# Altium schematic symbol library WR-TBL_Pluggable PCB Header.SchLib: 719 symbols (part 3 of 5) (continued)
## 691328310006 (continued)

## 691328310008
designator P?
WR-TBL Serie 3283 Double Level Horizontal PCB Header with Flanges & Nut Type, Pluggable, pitch 3.81mm, 8p; Part Number: 691328310008; Compliance: RoHS; Modularity: No; Pin Number: 8; Rated Current [UL]: 10A; Working Voltage [UL]: 300VAC; ComponentLink1Description: Manufacturer; ComponentLink1URL: http://www.we-online.de; ComponentLink2URL: https://katalog.we-online.de/em/datasheet/691328310008.pdf; ComponentLink2Description: Datasheet; Mounting Technology: THT; Packaging: Box; Operating Temperature: -40 to +105degC; PCB/Cable/Panel: PCB; Pitch: 3.81mm; Published Date: October 2019; Type: Double Level Horizontal; Publisher: Wurth Elektronik; Application: Pluggable
footprint 691328310008
pins: 1, 2, 3, 4, 5, 6, 7, 8

## 691328310010
designator P?
WR-TBL Serie 3283 Double Level Horizontal PCB Header with Flanges & Nut Type, Pluggable, pitch 3.81mm, 10p; Part Number: 691328310010; Compliance: RoHS; Modularity: No; Pin Number: 10; Rated Current [UL]: 10A; Working Voltage [UL]: 300VAC; ComponentLink1Description: Manufacturer; ComponentLink1URL: http://www.we-online.de; ComponentLink2URL: https://katalog.we-online.de/em/datasheet/691328310010.pdf; ComponentLink2Description: Datasheet; Mounting Technology: THT; Packaging: Box; Operating Temperature: -40 to +105degC; PCB/Cable/Panel: PCB; Pitch: 3.81mm; Published Date: October 2019; Type: Double Level Horizontal; Publisher: Wurth Elektronik; Application: Pluggable
footprint 691328310010
pins: 1, 2, 3, 4, 5, 6, 7, 8, 9, 10

## 691328310012
designator P?
WR-TBL Serie 3283 Double Level Horizontal PCB Header with Flanges & Nut Type, Pluggable, pitch 3.81mm, 12p; Part Number: 691328310012; Compliance: RoHS; Modularity: No; Pin Number: 12; Rated Current [UL]: 10A; Working Voltage [UL]: 300VAC; ComponentLink1Description: Manufacturer; ComponentLink1URL: http://www.we-online.de; ComponentLink2URL: https://katalog.we-online.de/em/datasheet/691328310012.pdf; ComponentLink2Description: Datasheet; Mounting Technology: THT; Packaging: Box; Operating Temperature: -40 to +105degC; PCB/Cable/Panel: PCB; Pitch: 3.81mm; Published Date: October 2019; Type: Double Level Horizontal; Publisher: Wurth Elektronik; Application: Pluggable
footprint 691328310012
pins: 1, 2, 3, 4, 5, 6, 7, 8, 9, 10, 11, 12

## 691328310016
designator P?
WR-TBL Serie 3283 Double Level Horizontal PCB Header with Flanges & Nut Type, Pluggable, pitch 3.81mm, 16p; Part Number: 691328310016; Compliance: RoHS; Modularity: No; Pin Number: 16; Rated Current [UL]: 10A; Working Voltage [UL]: 300VAC; ComponentLink1Description: Manufacturer; ComponentLink1URL: http://www.we-online.de; ComponentLink2URL: https://katalog.we-online.de/em/datasheet/691328310016.pdf; ComponentLink2Description: Datasheet; Mounting Technology: THT; Packaging: Box; Operating Temperature: -40 to +105degC; PCB/Cable/Panel: PCB; Pitch: 3.81mm; Published Date: October 2019; Type: Double Level Horizontal; Publisher: Wurth Elektronik; Application: Pluggable
footprint 691328310016
pins: 1, 2, 3, 4, 5, 6, 7, 8, 9, 10, 11, 12, 13, 14, 15, 16

## 691329300004
designator P?
WR-TBL Serie 3293 Double Level Vertical PCB Header, Pluggable, pitch 3.81mm, 4p; Part Number: 691329300004; Compliance: RoHS; Modularity: No; Pin Number: 4; Rated Current [UL]: 10A; Working Voltage [UL]: 300VAC; ComponentLink1Description: Manufacturer; ComponentLink1URL: http://www.we-online.de; ComponentLink2URL: https://katalog.we-online.de/em/datasheet/691329300004.pdf; ComponentLink2Description: Datasheet; Mounting Technology: THT; Packaging: Box; Operating Temperature: -40 to +105degC; PCB/Cable/Panel: PCB; Pitch: 3.81mm; Published Date: October 2019; Type: Double Level Vertical; Publisher: Wurth Elektronik; Application: Pluggable
footprint 691329300004
pins: 1, 2, 3, 4

## 691329300006
designator P?
WR-TBL Serie 3293 Double Level Vertical PCB Header, Pluggable, pitch 3.81mm, 6p; Part Number: 691329300006; Compliance: RoHS; Modularity: No; Pin Number: 6; Rated Current [UL]: 10A; Working Voltage [UL]: 300VAC; ComponentLink1Description: Manufacturer; ComponentLink1URL: http://www.we-online.de; ComponentLink2URL: https://katalog.we-online.de/em/datasheet/691329300006.pdf; ComponentLink2Description: Datasheet; Mounting Technology: THT; Packaging: Box; Operating Temperature: -40 to +105degC; PCB/Cable/Panel: PCB; Pitch: 3.81mm; Published Date: October 2019; Type: Double Level Vertical; Publisher: Wurth Elektronik; Application: Pluggable
footprint 691329300006
pins: 1, 2, 3, 4, 5, 6

## 691329300008
designator P?
WR-TBL Serie 3293 Double Level Vertical PCB Header, Pluggable, pitch 3.81mm, 8p; Part Number: 691329300008; Compliance: RoHS; Modularity: No; Pin Number: 8; Rated Current [UL]: 10A; Working Voltage [UL]: 300VAC; ComponentLink1Description: Manufacturer; ComponentLink1URL: http://www.we-online.de; ComponentLink2URL: https://katalog.we-online.de/em/datasheet/691329300008.pdf; ComponentLink2Description: Datasheet; Mounting Technology: THT; Packaging: Box; Operating Temperature: -40 to +105degC; PCB/Cable/Panel: PCB; Pitch: 3.81mm; Published Date: October 2019; Type: Double Level Vertical; Publisher: Wurth Elektronik; Application: Pluggable
footprint 691329300008
pins: 1, 2, 3, 4, 5, 6, 7, 8

## 691329300010
designator P?
WR-TBL Serie 3293 Double Level Vertical PCB Header, Pluggable, pitch 3.81mm, 10p; Part Number: 691329300010; Compliance: RoHS; Modularity: No; Pin Number: 10; Rated Current [UL]: 10A; Working Voltage [UL]: 300VAC; ComponentLink1Description: Manufacturer; ComponentLink1URL: http://www.we-online.de; ComponentLink2URL: https://katalog.we-online.de/em/datasheet/691329300010.pdf; ComponentLink2Description: Datasheet; Mounting Technology: THT; Packaging: Box; Operating Temperature: -40 to +105degC; PCB/Cable/Panel: PCB; Pitch: 3.81mm; Published Date: October 2019; Type: Double Level Vertical; Publisher: Wurth Elektronik; Application: Pluggable
footprint 691329300010
pins: 1, 2, 3, 4, 5, 6, 7, 8, 9, 10

## 691329300012
designator P?
WR-TBL Serie 3293 Double Level Vertical PCB Header, Pluggable, pitch 3.81mm, 12p; Part Number: 691329300012; Compliance: RoHS; Modularity: No; Pin Number: 12; Rated Current [UL]: 10A; Working Voltage [UL]: 300VAC; ComponentLink1Description: Manufacturer; ComponentLink1URL: http://www.we-online.de; ComponentLink2URL: https://katalog.we-online.de/em/datasheet/691329300012.pdf; ComponentLink2Description: Datasheet; Mounting Technology: THT; Packaging: Box; Operating Temperature: -40 to +105degC; PCB/Cable/Panel: PCB; Pitch: 3.81mm; Published Date: October 2019; Type: Double Level Vertical; Publisher: Wurth Elektronik; Application: Pluggable
footprint 691329300012
pins: 1, 2, 3, 4, 5, 6, 7, 8, 9, 10, 11, 12

## 691329300016
designator P?
WR-TBL Serie 3293 Double Level Vertical PCB Header, Pluggable, pitch 3.81mm, 16p; Part Number: 691329300016; Compliance: RoHS; Modularity: No; Pin Number: 16; Rated Current [UL]: 10A; Working Voltage [UL]: 300VAC; ComponentLink1Description: Manufacturer; ComponentLink1URL: http://www.we-online.de; ComponentLink2URL: https://katalog.we-online.de/em/datasheet/691329300016.pdf; ComponentLink2Description: Datasheet; Mounting Technology: THT; Packaging: Box; Operating Temperature: -40 to +105degC; PCB/Cable/Panel: PCB; Pitch: 3.81mm; Published Date: October 2019; Type: Double Level Vertical; Publisher: Wurth Elektronik; Application: Pluggable
footprint 691329300016
pins: 1, 2, 3, 4, 5, 6, 7, 8, 9, 10, 11, 12, 13, 14, 15, 16

## 691330300004
designator P?
WR-TBL Serie 3303 Double Level Vertical PCB Header with Flanges & Nut Type, Pluggable, pitch 3.81mm, 4p; Part Number: 691330300004; Compliance: RoHS; Modularity: No; Pin Number: 4; Rated Current [UL]: 10A; Working Voltage [UL]: 300VAC; ComponentLink1Description: Manufacturer; ComponentLink1URL: http://www.we-online.de; ComponentLink2URL: https://katalog.we-online.de/em/datasheet/691330300004.pdf; ComponentLink2Description: Datasheet; Mounting Technology: THT; Packaging: Box; Operating Temperature: -40 to +105degC; PCB/Cable/Panel: PCB; Pitch: 3.81mm; Published Date: October 2019; Type: Double Level Vertical; Publisher: Wurth Elektronik; Application: Pluggable
footprint 691330300004
pins: 1, 2, 3, 4

## 691330300006
designator P?
WR-TBL Serie 3303 Double Level Vertical PCB Header with Flanges & Nut Type, Pluggable, pitch 3.81mm, 6p; Part Number: 691330300006; Compliance: RoHS; Modularity: No; Pin Number: 6; Rated Current [UL]: 10A; Working Voltage [UL]: 300VAC; ComponentLink1Description: Manufacturer; ComponentLink1URL: http://www.we-online.de; ComponentLink2URL: https://katalog.we-online.de/em/datasheet/691330300006.pdf; ComponentLink2Description: Datasheet; Mounting Technology: THT; Packaging: Box; Operating Temperature: -40 to +105degC; PCB/Cable/Panel: PCB; Pitch: 3.81mm; Published Date: October 2019; Type: Double Level Vertical; Publisher: Wurth Elektronik; Application: Pluggable
footprint 691330300006
pins: 1, 2, 3, 4, 5, 6

## 691330300008
designator P?
WR-TBL Serie 3303 Double Level Vertical PCB Header with Flanges & Nut Type, Pluggable, pitch 3.81mm, 8p; Part Number: 691330300008; Compliance: RoHS; Modularity: No; Pin Number: 8; Rated Current [UL]: 10A; Working Voltage [UL]: 300VAC; ComponentLink1Description: Manufacturer; ComponentLink1URL: http://www.we-online.de; ComponentLink2URL: https://katalog.we-online.de/em/datasheet/691330300008.pdf; ComponentLink2Description: Datasheet; Mounting Technology: THT; Packaging: Box; Operating Temperature: -40 to +105degC; PCB/Cable/Panel: PCB; Pitch: 3.81mm; Published Date: October 2019; Type: Double Level Vertical; Publisher: Wurth Elektronik; Application: Pluggable
footprint 691330300008
pins: 1, 2, 3, 4, 5, 6, 7, 8

## 691330300010
designator P?
WR-TBL Serie 3303 Double Level Vertical PCB Header with Flanges & Nut Type, Pluggable, pitch 3.81mm, 10p; Part Number: 691330300010; Compliance: RoHS; Modularity: No; Pin Number: 10; Rated Current [UL]: 10A; Working Voltage [UL]: 300VAC; ComponentLink1Description: Manufacturer; ComponentLink1URL: http://www.we-online.de; ComponentLink2URL: https://katalog.we-online.de/em/datasheet/691330300010.pdf; ComponentLink2Description: Datasheet; Mounting Technology: THT; Packaging: Box; Operating Temperature: -40 to +105degC; PCB/Cable/Panel: PCB; Pitch: 3.81mm; Published Date: October 2019; Type: Double Level Vertical; Publisher: Wurth Elektronik; Application: Pluggable
footprint 691330300010
pins: 1, 2, 3, 4, 5, 6, 7, 8, 9, 10

## 691330300012
designator P?
WR-TBL Serie 3303 Double Level Vertical PCB Header with Flanges & Nut Type, Pluggable, pitch 3.81mm, 12p; Part Number: 691330300012; Compliance: RoHS; Modularity: No; Pin Number: 12; Rated Current [UL]: 10A; Working Voltage [UL]: 300VAC; ComponentLink1Description: Manufacturer; ComponentLink1URL: http://www.we-online.de; ComponentLink2URL: https://katalog.we-online.de/em/datasheet/691330300012.pdf; ComponentLink2Description: Datasheet; Mounting Technology: THT; Packaging: Box; Operating Temperature: -40 to +105degC; PCB/Cable/Panel: PCB; Pitch: 3.81mm; Published Date: October 2019; Type: Double Level Vertical; Publisher: Wurth Elektronik; Application: Pluggable
footprint 691330300012
pins: 1, 2, 3, 4, 5, 6, 7, 8, 9, 10, 11, 12

## 691330300016
designator P?
WR-TBL Serie 3303 Double Level Vertical PCB Header with Flanges & Nut Type, Pluggable, pitch 3.81mm, 16p; Part Number: 691330300016; Compliance: RoHS; Modularity: No; Pin Number: 16; Rated Current [UL]: 10A; Working Voltage [UL]: 300VAC; ComponentLink1Description: Manufacturer; ComponentLink1URL: http://www.we-online.de; ComponentLink2URL: https://katalog.we-online.de/em/datasheet/691330300016.pdf; ComponentLink2Description: Datasheet; Mounting Technology: THT; Packaging: Box; Operating Temperature: -40 to +105degC; PCB/Cable/Panel: PCB; Pitch: 3.81mm; Published Date: October 2019; Type: Double Level Vertical; Publisher: Wurth Elektronik; Application: Pluggable
footprint 691330300016
pins: 1, 2, 3, 4, 5, 6, 7, 8, 9, 10, 11, 12, 13, 14, 15, 16

## 691331510004
designator P?
WR-TBL Serie 3315 Double Level Horizontal PCB Header with Flanges, Pluggable, pitch 5.08mm, 4p; Part Number: 691331510004; Compliance: RoHS; Modularity: No; Pin Number: 4; Rated Current [UL]: 20A; Working Voltage [UL]: 300VAC; ComponentLink1Description: Manufacturer; ComponentLink1URL: http://www.we-online.de; ComponentLink2URL: https://katalog.we-online.de/em/datasheet/691331510004.pdf; ComponentLink2Description: Datasheet; Mounting Technology: THT; Packaging: Box; Operating Temperature: -40 to +105degC; PCB/Cable/Panel: PCB; Pitch: 5.08mm; Published Date: October 2019; Type: Double Level Horizontal; Publisher: Wurth Elektronik; Application: Pluggable
footprint 691331510004
pins: 1, 2, 3, 4

## 691331510006
designator P?
WR-TBL Serie 3315 Double Level Horizontal PCB Header with Flanges, Pluggable, pitch 5.08mm, 6p; Part Number: 691331510006; Compliance: RoHS; Modularity: No; Pin Number: 6; Rated Current [UL]: 20A; Working Voltage [UL]: 300VAC; ComponentLink1Description: Manufacturer; ComponentLink1URL: http://www.we-online.de; ComponentLink2URL: https://katalog.we-online.de/em/datasheet/691331510006.pdf; ComponentLink2Description: Datasheet; Mounting Technology: THT; Packaging: Box; Operating Temperature: -40 to +105degC; PCB/Cable/Panel: PCB; Pitch: 5.08mm; Published Date: October 2019; Type: Double Level Horizontal; Publisher: Wurth Elektronik; Application: Pluggable
footprint 691331510006
pins: 1, 2, 3, 4, 5, 6

## 691331510008
designator P?
WR-TBL Serie 3315 Double Level Horizontal PCB Header with Flanges, Pluggable, pitch 5.08mm, 8p; Part Number: 691331510008; Compliance: RoHS; Modularity: No; Pin Number: 8; Rated Current [UL]: 20A; Working Voltage [UL]: 300VAC; ComponentLink1Description: Manufacturer; ComponentLink1URL: http://www.we-online.de; ComponentLink2URL: https://katalog.we-online.de/em/datasheet/691331510008.pdf; ComponentLink2Description: Datasheet; Mounting Technology: THT; Packaging: Box; Operating Temperature: -40 to +105degC; PCB/Cable/Panel: PCB; Pitch: 5.08mm; Published Date: October 2019; Type: Double Level Horizontal; Publisher: Wurth Elektronik; Application: Pluggable
footprint 691331510008
pins: 1, 2, 3, 4, 5, 6, 7, 8

## 691331510010
designator P?
WR-TBL Serie 3315 Double Level Horizontal PCB Header with Flanges, Pluggable, pitch 5.08mm, 10p; Part Number: 691331510010; Compliance: RoHS; Modularity: No; Pin Number: 10; Rated Current [UL]: 20A; Working Voltage [UL]: 300VAC; ComponentLink1Description: Manufacturer; ComponentLink1URL: http://www.we-online.de; ComponentLink2URL: https://katalog.we-online.de/em/datasheet/691331510010.pdf; ComponentLink2Description: Datasheet; Mounting Technology: THT; Packaging: Box; Operating Temperature: -40 to +105degC; PCB/Cable/Panel: PCB; Pitch: 5.08mm; Published Date: October 2019; Type: Double Level Horizontal; Publisher: Wurth Elektronik; Application: Pluggable
footprint 691331510010
pins: 1, 2, 3, 4, 5, 6, 7, 8, 9, 10

## 691331510012
designator P?
WR-TBL Serie 3315 Double Level Horizontal PCB Header with Flanges, Pluggable, pitch 5.08mm, 12p; Part Number: 691331510012; Compliance: RoHS; Modularity: No; Pin Number: 12; Rated Current [UL]: 20A; Working Voltage [UL]: 300VAC; ComponentLink1Description: Manufacturer; ComponentLink1URL: http://www.we-online.de; ComponentLink2URL: https://katalog.we-online.de/em/datasheet/691331510012.pdf; ComponentLink2Description: Datasheet; Mounting Technology: THT; Packaging: Box; Operating Temperature: -40 to +105degC; PCB/Cable/Panel: PCB; Pitch: 5.08mm; Published Date: October 2019; Type: Double Level Horizontal; Publisher: Wurth Elektronik; Application: Pluggable
footprint 691331510012
pins: 1, 2, 3, 4, 5, 6, 7, 8, 9, 10, 11, 12

## 691331510016
designator P?
WR-TBL Serie 3315 Double Level Horizontal PCB Header with Flanges, Pluggable, pitch 5.08mm, 16p; Part Number: 691331510016; Compliance: RoHS; Modularity: No; Pin Number: 16; Rated Current [UL]: 20A; Working Voltage [UL]: 300VAC; ComponentLink1Description: Manufacturer; ComponentLink1URL: http://www.we-online.de; ComponentLink2URL: https://katalog.we-online.de/em/datasheet/691331510016.pdf; ComponentLink2Description: Datasheet; Mounting Technology: THT; Packaging: Box; Operating Temperature: -40 to +105degC; PCB/Cable/Panel: PCB; Pitch: 5.08mm; Published Date: October 2019; Type: Double Level Horizontal; Publisher: Wurth Elektronik; Application: Pluggable
footprint 691331510016
pins: 1, 2, 3, 4, 5, 6, 7, 8, 9, 10, 11, 12, 13, 14, 15, 16

## 691332510004
designator P?
WR-TBL Serie 3325 Double Level Horizontal PCB Header with Flanges & Nut Type, Pluggable, pitch 5.08mm, 4p; Part Number: 691332510004; Compliance: RoHS; Modularity: No; Pin Number: 4; Rated Current [UL]: 20A; Working Voltage [UL]: 300VAC; ComponentLink1Description: Manufacturer; ComponentLink1URL: http://www.we-online.de; ComponentLink2URL: https://katalog.we-online.de/em/datasheet/691332510004.pdf; ComponentLink2Description: Datasheet; Mounting Technology: THT; Packaging: Box; Operating Temperature: -40 to +105degC; PCB/Cable/Panel: PCB; Pitch: 5.08mm; Published Date: October 2019; Type: Double Level Horizontal; Publisher: Wurth Elektronik; Application: Pluggable
footprint 691332510004
pins: 1, 2, 3, 4

## 691332510006
designator P?
WR-TBL Serie 3325 Double Level Horizontal PCB Header with Flanges & Nut Type, Pluggable, pitch 5.08mm, 6p; Part Number: 691332510006; Compliance: RoHS; Modularity: No; Pin Number: 6; Rated Current [UL]: 20A; Working Voltage [UL]: 300VAC; ComponentLink1Description: Manufacturer; ComponentLink1URL: http://www.we-online.de; ComponentLink2URL: https://katalog.we-online.de/em/datasheet/691332510006.pdf; ComponentLink2Description: Datasheet; Mounting Technology: THT; Packaging: Box; Operating Temperature: -40 to +105degC; PCB/Cable/Panel: PCB; Pitch: 5.08mm; Published Date: October 2019; Type: Double Level Horizontal; Publisher: Wurth Elektronik; Application: Pluggable
footprint 691332510006
pins: 1, 2, 3, 4, 5, 6

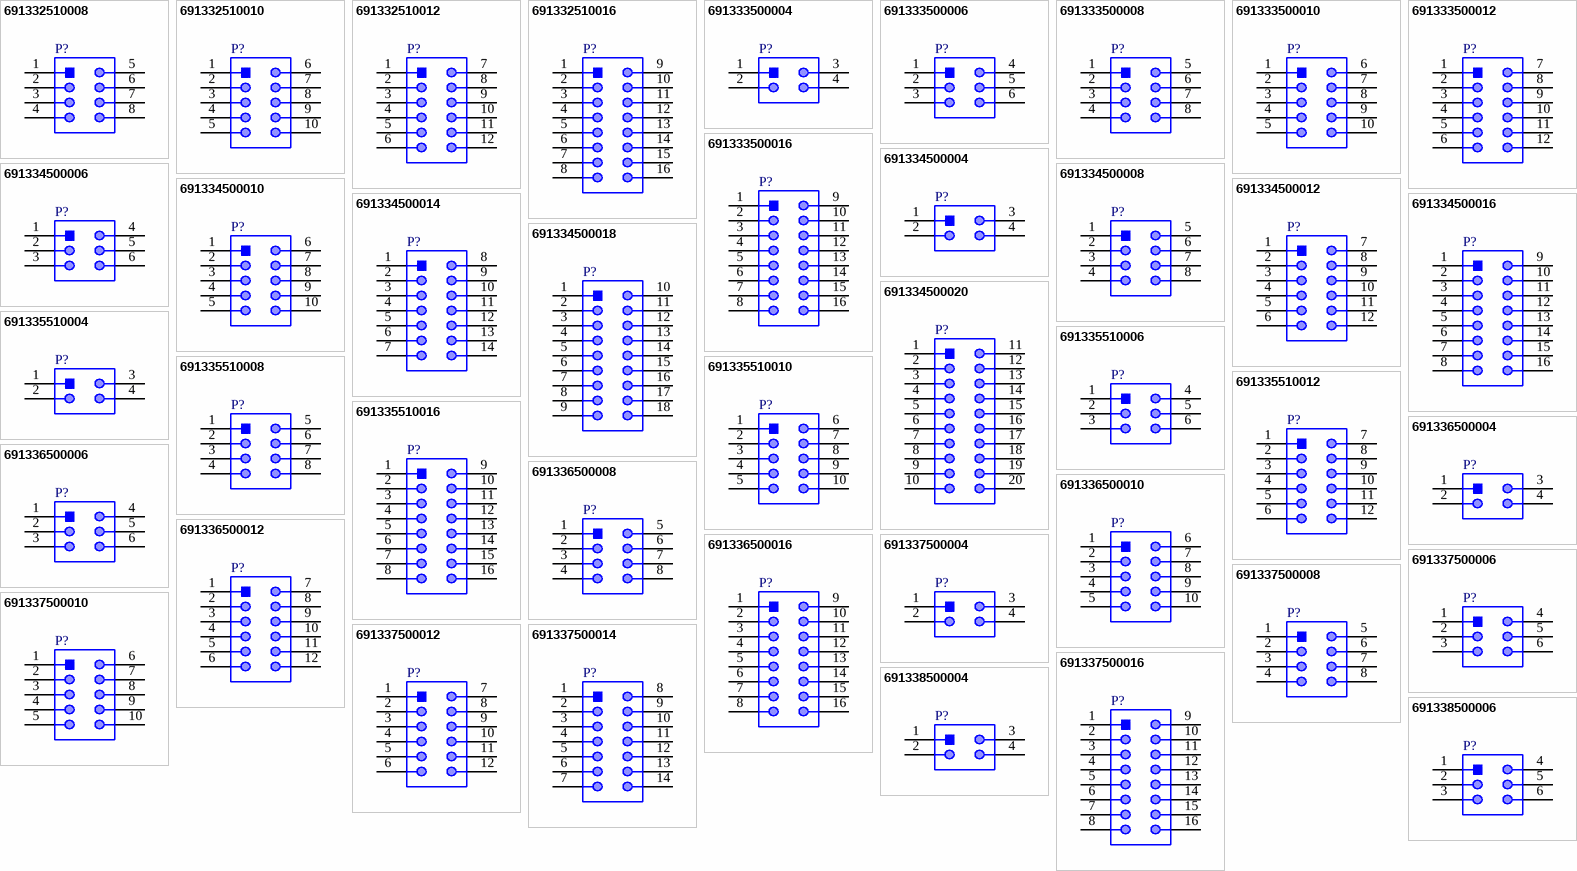
[diagram p12: symbols 691332510008 to 691338500006]

## 691332510008
designator P?
WR-TBL Serie 3325 Double Level Horizontal PCB Header with Flanges & Nut Type, Pluggable, pitch 5.08mm, 8p; Part Number: 691332510008; Compliance: RoHS; Modularity: No; Pin Number: 8; Rated Current [UL]: 20A; Working Voltage [UL]: 300VAC; ComponentLink1Description: Manufacturer; ComponentLink1URL: http://www.we-online.de; ComponentLink2URL: https://katalog.we-online.de/em/datasheet/691332510008.pdf; ComponentLink2Description: Datasheet; Mounting Technology: THT; Packaging: Box; Operating Temperature: -40 to +105degC; PCB/Cable/Panel: PCB; Pitch: 5.08mm; Published Date: October 2019; Type: Double Level Horizontal; Publisher: Wurth Elektronik; Application: Pluggable
footprint 691332510008
pins: 1, 2, 3, 4, 5, 6, 7, 8

## 691332510010
designator P?
WR-TBL Serie 3325 Double Level Horizontal PCB Header with Flanges & Nut Type, Pluggable, pitch 5.08mm, 10p; Part Number: 691332510010; Compliance: RoHS; Modularity: No; Pin Number: 10; Rated Current [UL]: 20A; Working Voltage [UL]: 300VAC; ComponentLink1Description: Manufacturer; ComponentLink1URL: http://www.we-online.de; ComponentLink2URL: https://katalog.we-online.de/em/datasheet/691332510010.pdf; ComponentLink2Description: Datasheet; Mounting Technology: THT; Packaging: Box; Operating Temperature: -40 to +105degC; PCB/Cable/Panel: PCB; Pitch: 5.08mm; Published Date: October 2019; Type: Double Level Horizontal; Publisher: Wurth Elektronik; Application: Pluggable
footprint 691332510010
pins: 1, 2, 3, 4, 5, 6, 7, 8, 9, 10

## 691332510012
designator P?
WR-TBL Serie 3325 Double Level Horizontal PCB Header with Flanges & Nut Type, Pluggable, pitch 5.08mm, 12p; Part Number: 691332510012; Compliance: RoHS; Modularity: No; Pin Number: 12; Rated Current [UL]: 20A; Working Voltage [UL]: 300VAC; ComponentLink1Description: Manufacturer; ComponentLink1URL: http://www.we-online.de; ComponentLink2URL: https://katalog.we-online.de/em/datasheet/691332510012.pdf; ComponentLink2Description: Datasheet; Mounting Technology: THT; Packaging: Box; Operating Temperature: -40 to +105degC; PCB/Cable/Panel: PCB; Pitch: 5.08mm; Published Date: October 2019; Type: Double Level Horizontal; Publisher: Wurth Elektronik; Application: Pluggable
footprint 691332510012
pins: 1, 2, 3, 4, 5, 6, 7, 8, 9, 10, 11, 12

## 691332510016
designator P?
WR-TBL Serie 3325 Double Level Horizontal PCB Header with Flanges & Nut Type, Pluggable, pitch 5.08mm, 16p; Part Number: 691332510016; Compliance: RoHS; Modularity: No; Pin Number: 16; Rated Current [UL]: 20A; Working Voltage [UL]: 300VAC; ComponentLink1Description: Manufacturer; ComponentLink1URL: http://www.we-online.de; ComponentLink2URL: https://katalog.we-online.de/em/datasheet/691332510016.pdf; ComponentLink2Description: Datasheet; Mounting Technology: THT; Packaging: Box; Operating Temperature: -40 to +105degC; PCB/Cable/Panel: PCB; Pitch: 5.08mm; Published Date: October 2019; Type: Double Level Horizontal; Publisher: Wurth Elektronik; Application: Pluggable
footprint 691332510016
pins: 1, 2, 3, 4, 5, 6, 7, 8, 9, 10, 11, 12, 13, 14, 15, 16

## 691333500004
designator P?
WR-TBL Serie 3335 Double Level Vertical PCB Header with Flanges, Pluggable, pitch 5.08mm, 4p; Part Number: 691333500004; Compliance: RoHS; Modularity: No; Pin Number: 4; Rated Current [UL]: 20A; Working Voltage [UL]: 300VAC; ComponentLink1Description: Manufacturer; ComponentLink1URL: http://www.we-online.de; ComponentLink2URL: https://katalog.we-online.de/em/datasheet/691333500004.pdf; ComponentLink2Description: Datasheet; Mounting Technology: THT; Packaging: Box; Operating Temperature: -40 to +105degC; PCB/Cable/Panel: PCB; Pitch: 5.08mm; Published Date: October 2019; Type: Double Level Vertical; Publisher: Wurth Elektronik; Application: Pluggable
footprint 691333500004
pins: 1, 2, 3, 4

## 691333500006
designator P?
WR-TBL Serie 3335 Double Level Vertical PCB Header with Flanges, Pluggable, pitch 5.08mm, 6p; Part Number: 691333500006; Compliance: RoHS; Modularity: No; Pin Number: 6; Rated Current [UL]: 20A; Working Voltage [UL]: 300VAC; ComponentLink1Description: Manufacturer; ComponentLink1URL: http://www.we-online.de; ComponentLink2URL: https://katalog.we-online.de/em/datasheet/691333500006.pdf; ComponentLink2Description: Datasheet; Mounting Technology: THT; Packaging: Box; Operating Temperature: -40 to +105degC; PCB/Cable/Panel: PCB; Pitch: 5.08mm; Published Date: October 2019; Type: Double Level Vertical; Publisher: Wurth Elektronik; Application: Pluggable
footprint 691333500006
pins: 1, 2, 3, 4, 5, 6

## 691333500008
designator P?
WR-TBL Serie 3335 Double Level Vertical PCB Header with Flanges, Pluggable, pitch 5.08mm, 8p; Part Number: 691333500008; Compliance: RoHS; Modularity: No; Pin Number: 8; Rated Current [UL]: 20A; Working Voltage [UL]: 300VAC; ComponentLink1Description: Manufacturer; ComponentLink1URL: http://www.we-online.de; ComponentLink2URL: https://katalog.we-online.de/em/datasheet/691333500008.pdf; ComponentLink2Description: Datasheet; Mounting Technology: THT; Packaging: Box; Operating Temperature: -40 to +105degC; PCB/Cable/Panel: PCB; Pitch: 5.08mm; Published Date: October 2019; Type: Double Level Vertical; Publisher: Wurth Elektronik; Application: Pluggable
footprint 691333500008
pins: 1, 2, 3, 4, 5, 6, 7, 8

## 691333500010
designator P?
WR-TBL Serie 3335 Double Level Vertical PCB Header with Flanges, Pluggable, pitch 5.08mm, 10p; Part Number: 691333500010; Compliance: RoHS; Modularity: No; Pin Number: 10; Rated Current [UL]: 20A; Working Voltage [UL]: 300VAC; ComponentLink1Description: Manufacturer; ComponentLink1URL: http://www.we-online.de; ComponentLink2URL: https://katalog.we-online.de/em/datasheet/691333500010.pdf; ComponentLink2Description: Datasheet; Mounting Technology: THT; Packaging: Box; Operating Temperature: -40 to +105degC; PCB/Cable/Panel: PCB; Pitch: 5.08mm; Published Date: October 2019; Type: Double Level Vertical; Publisher: Wurth Elektronik; Application: Pluggable
footprint 691333500010
pins: 1, 2, 3, 4, 5, 6, 7, 8, 9, 10

## 691333500012
designator P?
WR-TBL Serie 3335 Double Level Vertical PCB Header with Flanges, Pluggable, pitch 5.08mm, 12p; Part Number: 691333500012; Compliance: RoHS; Modularity: No; Pin Number: 12; Rated Current [UL]: 20A; Working Voltage [UL]: 300VAC; ComponentLink1Description: Manufacturer; ComponentLink1URL: http://www.we-online.de; ComponentLink2URL: https://katalog.we-online.de/em/datasheet/691333500012.pdf; ComponentLink2Description: Datasheet; Mounting Technology: THT; Packaging: Box; Operating Temperature: -40 to +105degC; PCB/Cable/Panel: PCB; Pitch: 5.08mm; Published Date: October 2019; Type: Double Level Vertical; Publisher: Wurth Elektronik; Application: Pluggable
footprint 691333500012
pins: 1, 2, 3, 4, 5, 6, 7, 8, 9, 10, 11, 12

## 691333500016
designator P?
WR-TBL Serie 3335 Double Level Vertical PCB Header with Flanges, Pluggable, pitch 5.08mm, 16p; Part Number: 691333500016; Compliance: RoHS; Modularity: No; Pin Number: 16; Rated Current [UL]: 20A; Working Voltage [UL]: 300VAC; ComponentLink1Description: Manufacturer; ComponentLink1URL: http://www.we-online.de; ComponentLink2URL: https://katalog.we-online.de/em/datasheet/691333500016.pdf; ComponentLink2Description: Datasheet; Mounting Technology: THT; Packaging: Box; Operating Temperature: -40 to +105degC; PCB/Cable/Panel: PCB; Pitch: 5.08mm; Published Date: October 2019; Type: Double Level Vertical; Publisher: Wurth Elektronik; Application: Pluggable
footprint 691333500016
pins: 1, 2, 3, 4, 5, 6, 7, 8, 9, 10, 11, 12, 13, 14, 15, 16

## 691334500004
designator P?
WR-TBL Serie 3345 Double Level Vertical PCB Header with Flanges & Nut Type, Pluggable, pitch 5.08mm, 4p; Part Number: 691334500004; Compliance: RoHS; Modularity: No; Pin Number: 4; Rated Current [UL]: 20A; Working Voltage [UL]: 300VAC; ComponentLink1Description: Manufacturer; ComponentLink1URL: http://www.we-online.de; ComponentLink2URL: https://katalog.we-online.de/em/datasheet/691334500004.pdf; ComponentLink2Description: Datasheet; Mounting Technology: THT; Packaging: Box; Operating Temperature: -40 to +105degC; PCB/Cable/Panel: PCB; Pitch: 5.08mm; Published Date: October 2019; Type: Double Level Vertical; Publisher: Wurth Elektronik; Application: Pluggable
footprint 691334500004
pins: 1, 2, 3, 4

## 691334500006
designator P?
WR-TBL Serie 3345 Double Level Vertical PCB Header with Flanges & Nut Type, Pluggable, pitch 5.08mm, 6p; Part Number: 691334500006; Compliance: RoHS; Modularity: No; Pin Number: 6; Rated Current [UL]: 20A; Working Voltage [UL]: 300VAC; ComponentLink1Description: Manufacturer; ComponentLink1URL: http://www.we-online.de; ComponentLink2URL: https://katalog.we-online.de/em/datasheet/691334500006.pdf; ComponentLink2Description: Datasheet; Mounting Technology: THT; Packaging: Box; Operating Temperature: -40 to +105degC; PCB/Cable/Panel: PCB; Pitch: 5.08mm; Published Date: October 2019; Type: Double Level Vertical; Publisher: Wurth Elektronik; Application: Pluggable
footprint 691334500006
pins: 1, 2, 3, 4, 5, 6

## 691334500008
designator P?
WR-TBL Serie 3345 Double Level Vertical PCB Header with Flanges & Nut Type, Pluggable, pitch 5.08mm, 8p; Part Number: 691334500008; Compliance: RoHS; Modularity: No; Pin Number: 8; Rated Current [UL]: 20A; Working Voltage [UL]: 300VAC; ComponentLink1Description: Manufacturer; ComponentLink1URL: http://www.we-online.de; ComponentLink2URL: https://katalog.we-online.de/em/datasheet/691334500008.pdf; ComponentLink2Description: Datasheet; Mounting Technology: THT; Packaging: Box; Operating Temperature: -40 to +105degC; PCB/Cable/Panel: PCB; Pitch: 5.08mm; Published Date: October 2019; Type: Double Level Vertical; Publisher: Wurth Elektronik; Application: Pluggable
footprint 691334500008
pins: 1, 2, 3, 4, 5, 6, 7, 8

## 691334500010
designator P?
WR-TBL Serie 3345 Double Level Vertical PCB Header with Flanges & Nut Type, Pluggable, pitch 5.08mm, 10p; Part Number: 691334500010; Compliance: RoHS; Modularity: No; Pin Number: 10; Rated Current [UL]: 20A; Working Voltage [UL]: 300VAC; ComponentLink1Description: Manufacturer; ComponentLink1URL: http://www.we-online.de; ComponentLink2URL: https://katalog.we-online.de/em/datasheet/691334500010.pdf; ComponentLink2Description: Datasheet; Mounting Technology: THT; Packaging: Box; Operating Temperature: -40 to +105degC; PCB/Cable/Panel: PCB; Pitch: 5.08mm; Published Date: October 2019; Type: Double Level Vertical; Publisher: Wurth Elektronik; Application: Pluggable
footprint 691334500010
pins: 1, 2, 3, 4, 5, 6, 7, 8, 9, 10

## 691334500012
designator P?
WR-TBL Serie 3345 Double Level Vertical PCB Header with Flanges & Nut Type, Pluggable, pitch 5.08mm, 12p; Part Number: 691334500012; Compliance: RoHS; Modularity: No; Pin Number: 12; Rated Current [UL]: 20A; Working Voltage [UL]: 300VAC; ComponentLink1Description: Manufacturer; ComponentLink1URL: http://www.we-online.de; ComponentLink2URL: https://katalog.we-online.de/em/datasheet/691334500012.pdf; ComponentLink2Description: Datasheet; Mounting Technology: THT; Packaging: Box; Operating Temperature: -40 to +105degC; PCB/Cable/Panel: PCB; Pitch: 5.08mm; Published Date: October 2019; Type: Double Level Vertical; Publisher: Wurth Elektronik; Application: Pluggable
footprint 691334500012
pins: 1, 2, 3, 4, 5, 6, 7, 8, 9, 10, 11, 12

## 691334500014
designator P?
WR-TBL Serie 3345 Double Level Vertical PCB Header with Flanges & Nut Type, Pluggable, pitch 5.08mm, 14p; Part Number: 691334500014; Compliance: RoHS; Modularity: No; Pin Number: 14; Rated Current [UL]: 20A; Working Voltage [UL]: 300VAC; ComponentLink1Description: Manufacturer; ComponentLink1URL: http://www.we-online.de; ComponentLink2URL: https://katalog.we-online.de/em/datasheet/691334500014.pdf; ComponentLink2Description: Datasheet; Mounting Technology: THT; Packaging: Box; Operating Temperature: -40 to +105degC; PCB/Cable/Panel: PCB; Pitch: 5.08mm; Published Date: October 2019; Type: Double Level Vertical; Publisher: Wurth Elektronik; Application: Pluggable
footprint 691334500014
pins: 1, 2, 3, 4, 5, 6, 7, 8, 9, 10, 11, 12, 13, 14

## 691334500016
designator P?
WR-TBL Serie 3345 Double Level Vertical PCB Header with Flanges & Nut Type, Pluggable, pitch 5.08mm, 16p; Part Number: 691334500016; Compliance: RoHS; Modularity: No; Pin Number: 16; Rated Current [UL]: 20A; Working Voltage [UL]: 300VAC; ComponentLink1Description: Manufacturer; ComponentLink1URL: http://www.we-online.de; ComponentLink2URL: https://katalog.we-online.de/em/datasheet/691334500016.pdf; ComponentLink2Description: Datasheet; Mounting Technology: THT; Packaging: Box; Operating Temperature: -40 to +105degC; PCB/Cable/Panel: PCB; Pitch: 5.08mm; Published Date: October 2019; Type: Double Level Vertical; Publisher: Wurth Elektronik; Application: Pluggable
footprint 691334500016
pins: 1, 2, 3, 4, 5, 6, 7, 8, 9, 10, 11, 12, 13, 14, 15, 16

## 691334500018
designator P?
WR-TBL Serie 3345 Double Level Vertical PCB Header with Flanges & Nut Type, Pluggable, pitch 5.08mm, 18p; Part Number: 691334500018; Compliance: RoHS; Modularity: No; Pin Number: 18; Rated Current [UL]: 20A; Working Voltage [UL]: 300VAC; ComponentLink1Description: Manufacturer; ComponentLink1URL: http://www.we-online.de; ComponentLink2URL: https://katalog.we-online.de/em/datasheet/691334500018.pdf; ComponentLink2Description: Datasheet; Mounting Technology: THT; Packaging: Box; Operating Temperature: -40 to +105degC; PCB/Cable/Panel: PCB; Pitch: 5.08mm; Published Date: October 2019; Type: Double Level Vertical; Publisher: Wurth Elektronik; Application: Pluggable
footprint 691334500018
pins: 1, 2, 3, 4, 5, 6, 7, 8, 9, 10, 11, 12, 13, 14, 15, 16, 17, 18